# Altium footprint library Standard2.PcbLib: 423 footprints (part 11 of 27)
Each footprint in its own frame and in the unit in brackets; x right, y up, seen from the top. Pads: shape width x height; smd on the part's side, far side on the other; paste and mask are expansions set on the pad; w line width, h text height; cw(c..) or ccw(c..) is an arc to the next point about the centre after c.
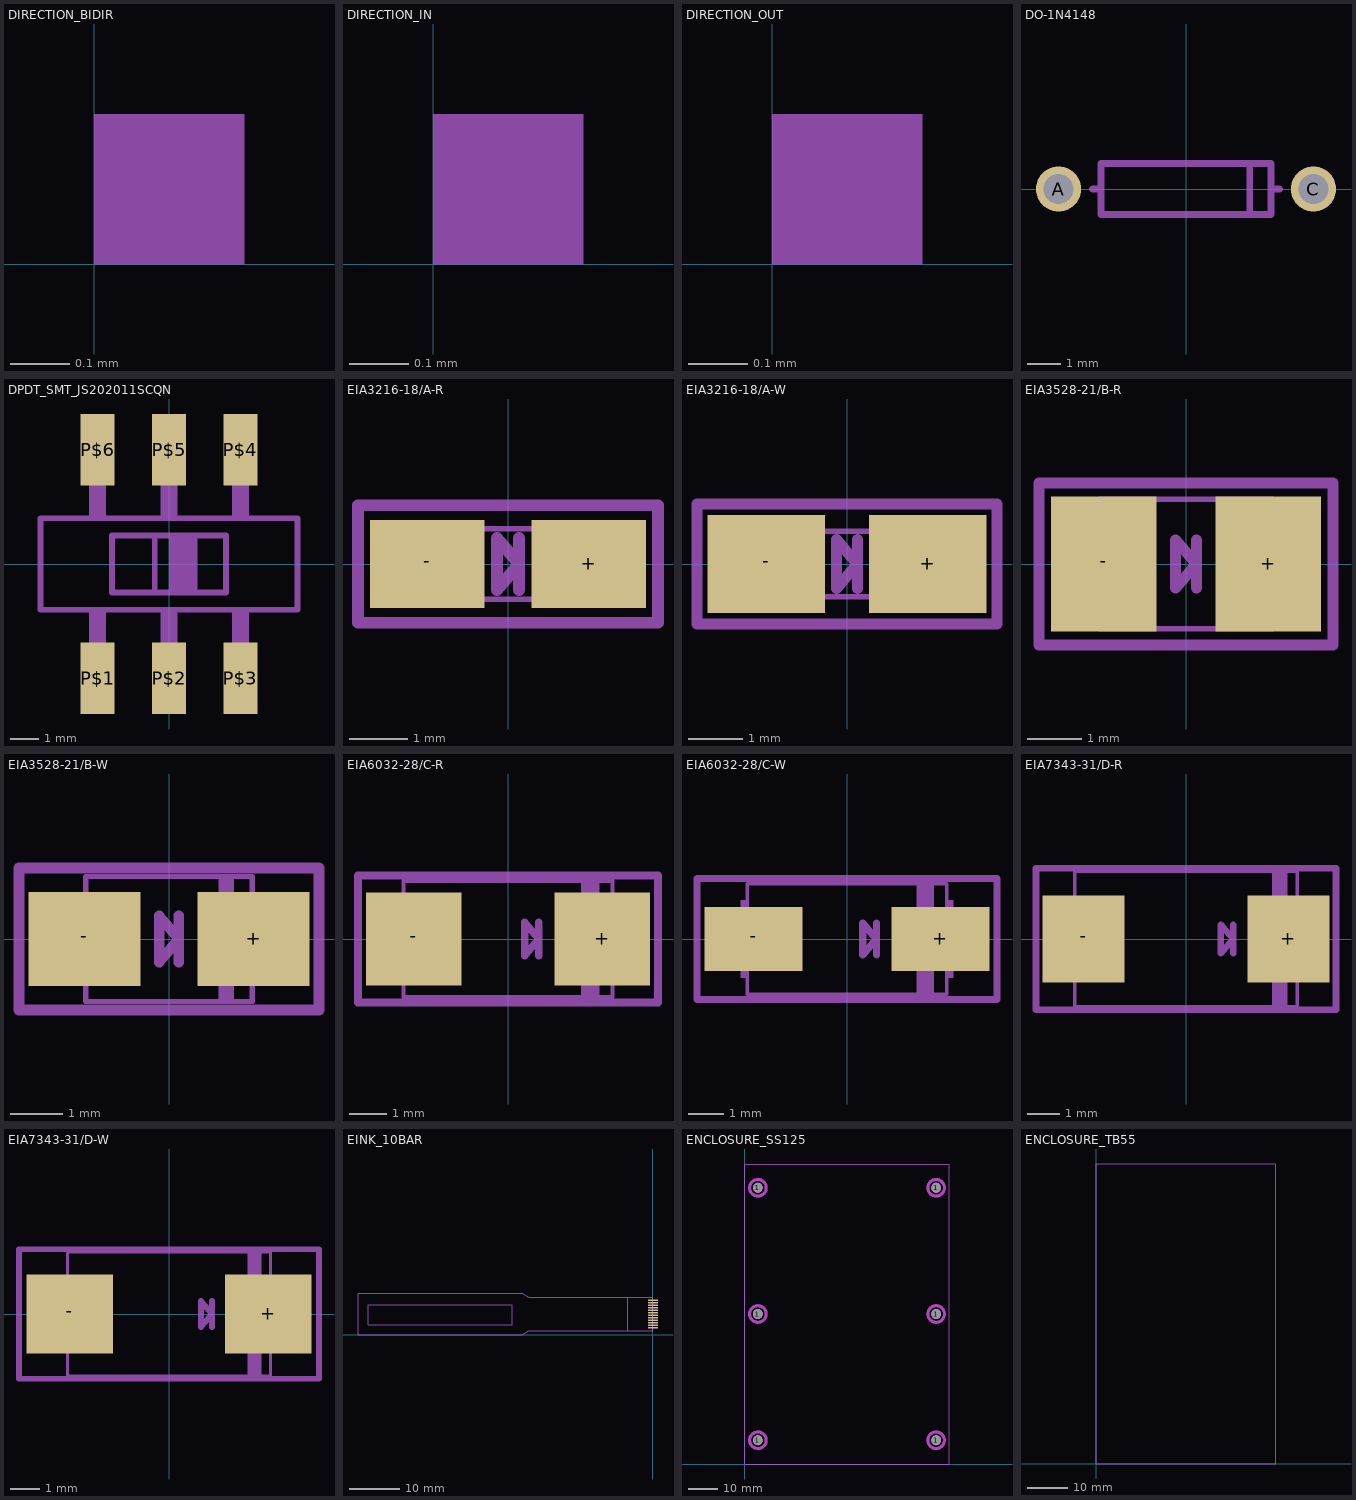
[diagram p10: the footprints below, top view; thin cyan lines are the x and y axes]

## DIRECTION_BIDIR [mm]
Mechanical 2:
  region: 0,0 0.254,0 0.254,0.254 0,0.254
  region: 0,0 0.254,0 0.254,0.254 0,0.254

## DIRECTION_IN [mm]
Mechanical 2:
  region: 0,0 0.254,0 0.254,0.254 0,0.254

## DIRECTION_OUT [mm]
Mechanical 2:
  region: 0,0 0.254,0 0.254,0.254 0,0.254

## DO-1N4148 [mm]
pads (2):
  round 1.35 hole 0.9: A(-3.81,0) C(3.81,0)
Mechanical 2:
  lines w0.203: -2.794,0 -2.54,0 ; 1.905,-0.635 1.905,0.635 ; 2.794,0 2.54,0 ; -2.54,0 -2.54,-0.762 2.54,-0.762 2.54,0 ; -2.54,0 -2.54,0.762 2.54,0.762 2.54,0

## DPDT_SMT_JS202011SCQN [mm]
pads (6):
  rect 1.2x2.5 smd: P$1(-2.5,-4) P$2(0,-4) P$3(2.5,-4) P$4(2.5,4) P$5(0,4) P$6(-2.5,4)
Mechanical 2:
  lines w0.203: -3.2,-1.6 -4.5,-1.6 -4.5,1.6 -3.2,1.6 ; 3.2,-1.6 4.5,-1.6 4.5,1.6 3.2,1.6
Mechanical 18:
  rectangle: 0,-1 1,1
  rectangle: -0.3,1.6 0.3,3.9
  rectangle: -2.8,1.65 -2.2,3.9
  rectangle: 2.2,1.65 2.8,3.9
  region: 2.8,-1.65 2.2,-1.65 2.2,-3.9 2.8,-3.9
  region: 0.3,-1.65 -0.3,-1.65 -0.3,-3.9 0.3,-3.9
  region: -2.2,-1.65 -2.8,-1.65 -2.8,-3.9 -2.2,-3.9
  lines w0.127: -4.5,-1.6 -4.5,1.6 ; 4.5,-1.6 4.5,1.6
  lines w0.203: -4.5,-1.6 4.5,-1.6 ; -4.5,1.6 4.5,1.6 ; -0.5,-1 2,-1 2,1 -0.5,1 ; -0.5,-1 -2,-1 -2,1 -0.5,1 ; -0.5,-1 -0.5,1

## EIA3216-18/A-R [mm]
pads (2):
  rect 1.95x1.5 smd: +(1.375,0) -(-1.375,0)
Mechanical 2:
  lines w0.203: 0.191,-0.445 0.191,0.445 ; 2.552,0.878 2.552,-1 -2.552,-1 -2.552,1 2.552,1 2.552,0.9 ; -0.191,-0.445 -0.191,0.445 0.191,0 -0.191,-0.445
Mechanical 18:
  rectangle: -1.6,-0.6 -1.475,0.6
  rectangle: 1.475,-0.6 1.6,0.6
  rectangle: 0.8,-0.625 1.1,0.625
  lines w0.102: -1.45,-0.6 1.45,-0.6 1.45,0.6 -1.45,0.6 -1.45,-0.6

## EIA3216-18/A-W [mm]
pads (2):
  rect 2.15x1.8 smd: +(1.475,0) -(-1.475,0)
Mechanical 2:
  lines w0.203: 0.191,-0.445 0.191,0.445 ; -2.743,-1.1 -2.743,1.1 2.743,1.1 2.743,-1.1 -2.743,-1.1 ; -0.191,-0.445 -0.191,0.445 0.191,0 -0.191,-0.445
Mechanical 18:
  rectangle: -1.6,-0.6 -1.475,0.6
  rectangle: 1.475,-0.6 1.6,0.6
  rectangle: 0.8,-0.625 1.1,0.625
  lines w0.102: -1.45,-0.6 1.45,-0.6 1.45,0.6 -1.45,0.6 -1.45,-0.6

## EIA3528-21/B-R [mm]
pads (2):
  rect 1.95x2.5 smd: +(1.525,0) -(-1.525,0)
Mechanical 2:
  lines w0.203: 0.191,-0.445 0.191,0.445 ; -2.716,-1.5 -2.716,1.5 2.716,1.5 2.716,-1.5 -2.716,-1.5 ; -0.191,-0.445 -0.191,0.445 0.191,0 -0.191,-0.445
Mechanical 18:
  rectangle: -1.75,-0.6 -1.625,0.6
  rectangle: 1.625,-0.6 1.75,0.6
  rectangle: 0.95,-1.225 1.25,1.225
  lines w0.102: -1.6,-1.2 1.6,-1.2 1.6,1.2 -1.6,1.2 -1.6,-1.2

## EIA3528-21/B-W [mm]
pads (2):
  rect 2.15x1.8 smd: +(1.625,0) -(-1.625,0)
Mechanical 2:
  lines w0.203: 0.191,-0.445 0.191,0.445 ; -2.88,-1.363 -2.88,1.363 2.88,1.363 2.88,-1.363 -2.88,-1.363 ; -0.191,-0.445 -0.191,0.445 0.191,0 -0.191,-0.445
Mechanical 18:
  rectangle: -1.75,-0.6 -1.625,0.6
  rectangle: 1.625,-0.6 1.75,0.6
  rectangle: 0.95,-1.225 1.25,1.225
  lines w0.102: -1.6,-1.2 1.6,-1.2 1.6,1.2 -1.6,1.2 -1.6,-1.2

## EIA6032-28/C-R [mm]
pads (2):
  rect 2.55x2.5 smd: +(2.525,0) -(-2.525,0)
Mechanical 2:
  lines w0.203: 0.826,-0.445 0.826,0.445 ; -4.016,-1.7 -4.016,1.7 4.016,1.7 4.016,-1.7 -4.016,-1.7 ; 0.445,-0.445 0.445,0.445 0.826,0 0.445,-0.445
Mechanical 18:
  rectangle: -3,-1.1 -2.85,1.1
  rectangle: 2.85,-1.1 3,1.1
  rectangle: 1.95,-1.575 2.45,1.575
  lines w0.102: -2.8,-1.55 2.8,-1.55 2.8,1.55 -2.8,1.55 -2.8,-1.55

## EIA6032-28/C-W [mm]
pads (2):
  rect 2.75x1.8 smd: +(2.625,0) -(-2.625,0)
Mechanical 2:
  lines w0.203: 0.826,-0.445 0.826,0.445 ; -4.216,-1.7 -4.216,1.7 4.216,1.7 4.216,-1.7 -4.216,-1.7 ; 0.445,-0.445 0.445,0.445 0.826,0 0.445,-0.445
Mechanical 18:
  rectangle: -3,-1.1 -2.85,1.1
  rectangle: 2.85,-1.1 3,1.1
  rectangle: 1.95,-1.575 2.45,1.575
  lines w0.102: -2.8,-1.55 2.8,-1.55 2.8,1.55 -2.8,1.55 -2.8,-1.55

## EIA7343-31/D-R [mm]
pads (2):
  rect 2.55x2.7 smd: +(3.175,0) -(-3.175,0)
Mechanical 2:
  lines w0.203: 1.46,-0.445 1.46,0.445 ; -4.653,-2.2 -4.653,2.2 4.653,2.2 4.653,-2.2 -4.653,-2.2 ; 1.079,-0.445 1.079,0.445 1.46,0 1.079,-0.445
Mechanical 18:
  rectangle: -3.65,-1.2 -3.5,1.2
  rectangle: 3.5,-1.2 3.65,1.2
  rectangle: 2.675,-2.125 3.15,2.125
  lines w0.102: -3.45,-2.1 3.45,-2.1 3.45,2.1 -3.45,2.1 -3.45,-2.1

## EIA7343-31/D-W [mm]
pads (2):
  rect 2.95x2.7 smd: +(3.375,0) -(-3.375,0)
Mechanical 2:
  lines w0.203: 1.46,-0.445 1.46,0.445 ; -5.097,-2.2 5.097,-2.2 5.097,2.2 -5.097,2.2 -5.097,-2.2 ; 1.079,-0.445 1.46,0 1.079,0.445 1.079,-0.445
Mechanical 18:
  rectangle: 2.675,-2.125 3.15,2.125
  rectangle: 3.5,-1.2 3.65,1.2
  rectangle: -3.65,-1.2 -3.5,1.2
  lines w0.102: -3.45,-2.1 -3.45,2.1 3.45,2.1 3.45,-2.1 -3.45,-2.1

## EINK_10BAR [mm]
pads (12):
  rect 2x0.25 smd: P$1(0,1.4) P$2(0,1.9) P$3(0,2.4) P$4(0,2.9) P$5(0,3.4) P$6(0,3.9) P$7(0,4.4) P$8(0,4.9) P$9(0,5.4) P$10(0,5.9) P$11(0,6.4) P$12(0,6.9)
Mechanical 2:
  lines w0.203: 0,0.855 -24.72,0.855 -26,0 -58.72,0 -58.72,8.28 -26,8.28 -24.72,7.425 0,7.425
Mechanical 18:
  lines w0.203: -5,0.855 -5,7.425 ; 0,0.855 0,7.425 ; -56.72,2 -28.02,2 -28.02,6 -56.72,6 -56.72,2

## ENCLOSURE_SS125 [mm]
pads (6):
  round 3.2 hole 3.2: 1(4.5,8) 1(4.5,50.5) 1(4.5,93) 1(64.5,8) 1(64.5,50.5) 1(64.5,93)
Mechanical 1:
  lines w0: 0,0 69,0 ; 0,101 69,101
  lines w0.203: 0,0 0,101 ; 69,0 69,101
Mechanical 10 keep-out:
  circle w1: c64.5,8 r2.8
  circle w1: c4.5,8 r2.8
  circle w1: c64.5,93 r2.8
  circle w1: c4.5,93 r2.8
  circle w1: c64.5,50.5 r2.8
  circle w1: c4.5,50.5 r2.8
Mechanical 11 keep-out:
  circle w1: c64.5,8 r2.8
  circle w1: c4.5,8 r2.8
  circle w1: c64.5,93 r2.8
  circle w1: c4.5,93 r2.8
  circle w1: c64.5,50.5 r2.8
  circle w1: c4.5,50.5 r2.8
Mechanical 18:
  circle w0.203: c64.5,8 r1.5
  circle w0.203: c4.5,8 r1.5
  circle w0.203: c64.5,93 r1.5
  circle w0.203: c4.5,93 r1.5
  circle w0.203: c64.5,50.5 r1.5
  circle w0.203: c4.5,50.5 r1.5

## ENCLOSURE_TB55 [mm]
Mechanical 1:
  lines w0: 0,0 45,0 45,75 0,75 0,0